# Altium footprint library MS-Electronic.PcbLib: 202 footprints (part 5 of 13)
Each footprint in its own frame and in the unit in brackets; x right, y up, seen from the top. Pads: shape width x height; smd on the part's side, far side on the other; paste and mask are expansions set on the pad; w line width, h text height; cw(c..) or ccw(c..) is an arc to the next point about the centre after c.
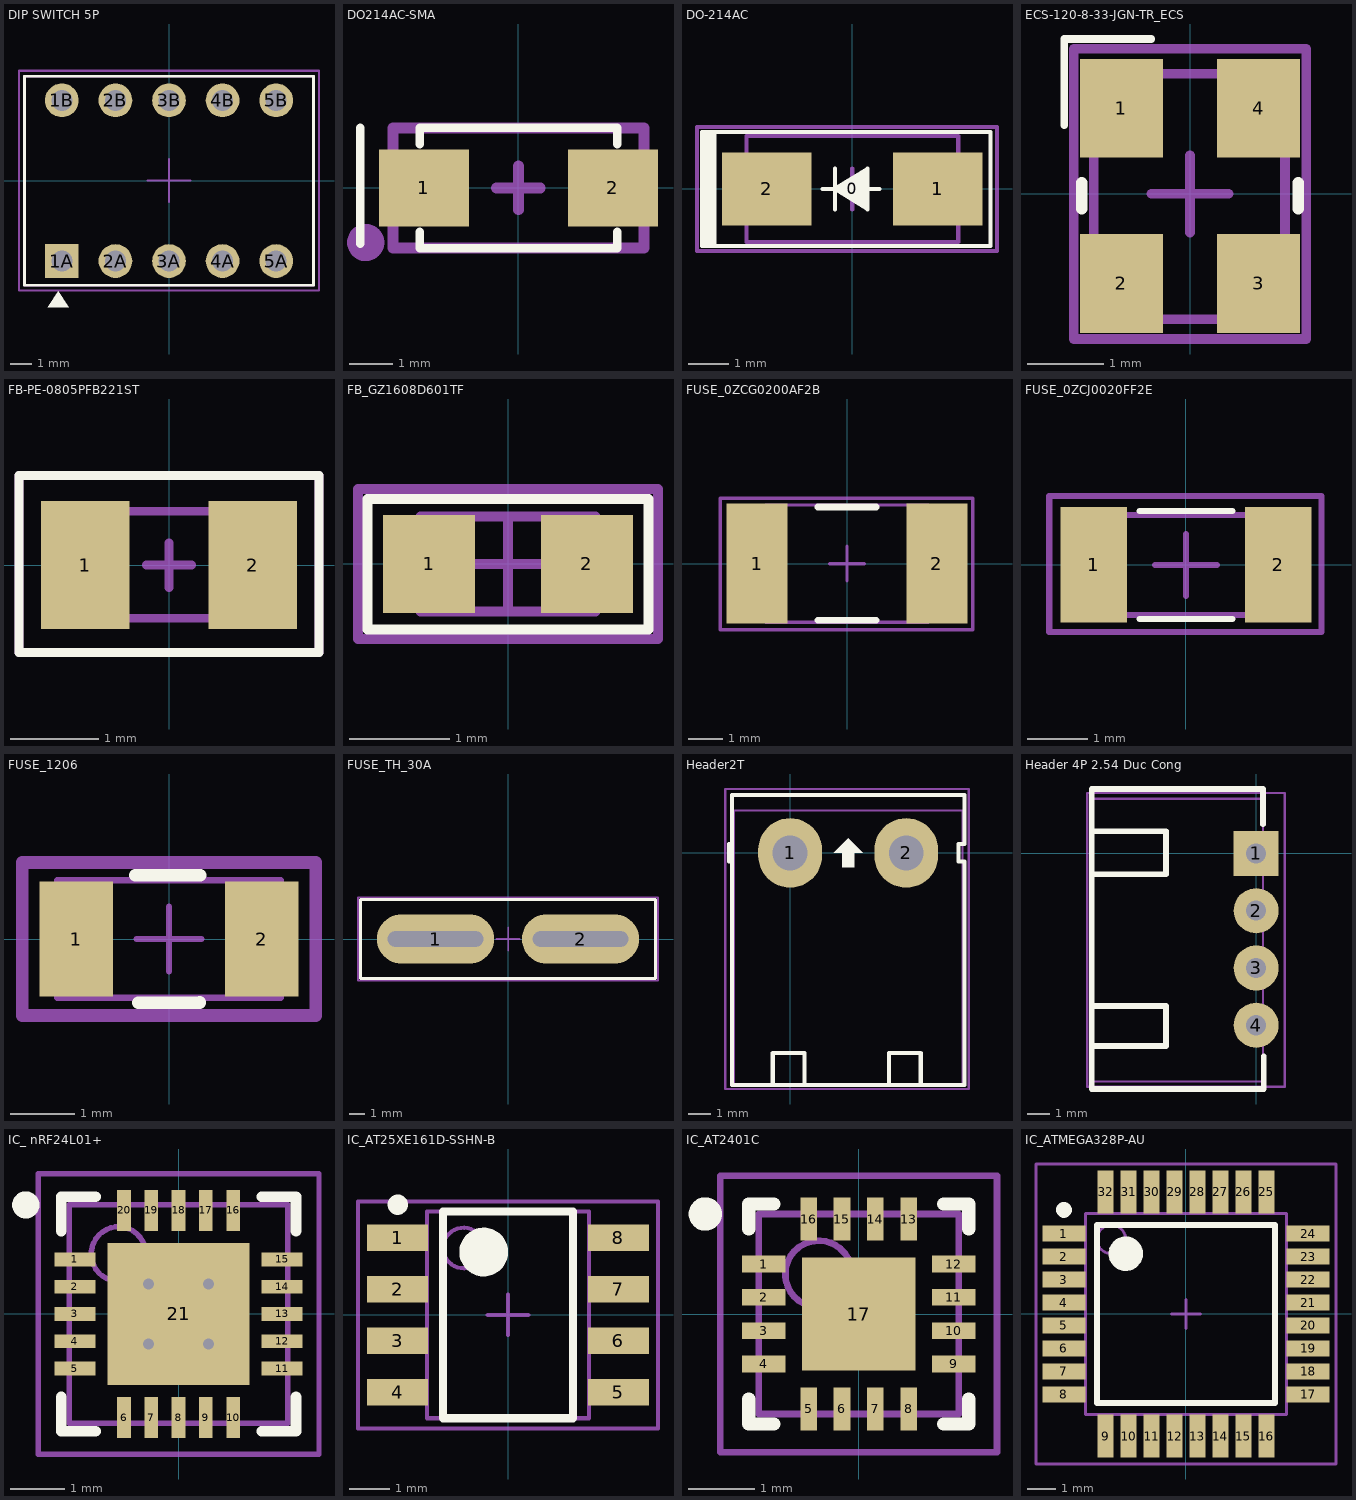
[diagram p4: the footprints below, top view; thin cyan lines are the x and y axes]

## DIP SWITCH 5P [mm]
pads (10):
  rect 1.6x1.6 hole 1: 1A(-5.08,-3.81)
  round 1.6 hole 1: 1B(-5.08,3.81) 2A(-2.54,-3.81) 2B(-2.54,3.81) 3A(0,-3.81) 3B(0,3.81) 4A(2.54,-3.81) 4B(2.54,3.81) 5A(5.08,-3.81) 5B(5.08,3.81)
Top Overlay:
  region: -5.25,-5.25 -4.75,-6 -5.75,-6
  lines w0.127: -6.85,-4.95 6.85,-4.95 6.85,4.95 -6.85,4.95 -6.85,-4.95
Top Assembly:
  lines w0.127: -6.85,-4.95 6.85,-4.95 6.85,4.95 -6.85,4.95 -6.85,-4.95
  text ".Designator" at -2.499,-0.167 h0.5
Top Component Center (Mech15):
  lines w0.1: -1.016,0 0,0 ; 0,-1.016 0,0 ; 0,1.016 0,0 ; 1.016,0 0,0 ; -7.112,-5.208 -7.112,5.212 7.112,5.212 7.112,-5.208 -7.112,-5.208
3D body "DIP Switch x05 Red.stp": height 6.95, standoff -3.3, extent -6.85,-4.95 6.85,4.95

## DO214AC-SMA [mm]
pads (2):
  rect 2.1x1.8 smd: 1(-2.2,0) 2(2.2,0)
Top Overlay:
  lines w0.2: -3.683,-1.303 -3.683,1.397 ; -2.3,-1.016 -2.3,-1.4 2.3,-1.4 2.3,-1.016 ; -2.3,1.016 -2.3,1.4 2.3,1.4 2.3,1.016
Top Assembly:
  circle w0.508: c-3.556,-1.27 r0.18
  lines w0.254: -2.921,-1.397 2.921,-1.397 2.921,1.397 -2.921,1.397 -2.921,-1.397
  text "'.Designator'" at -6.143,-0.574 h2.54
Top Component Center (Mech15):
  lines w0.254: -0.508,0 0,0 ; 0,-0.508 0,0 ; 0,0.508 0,0 ; 0.508,0 0,0 ; -2.921,-1.397 2.921,-1.397 2.921,1.397 -2.921,1.397 -2.921,-1.397
3D body "SW3dPS-DO-214AC SMA.STEP": height 2.41, standoff 0.01, extent -2.622,-1.3 2.578,1.3

## DO-214AC [mm]
pads (3):
  round 0.508 on Mech14: 0(0,0)
  rect 2.2x1.8 smd: 1(2.1,0) 2(-2.1,0)
Top Overlay:
  rectangle: -3.686,-1.399 -3.386,1.401
  region: 0.375,-0.5 0.375,0.5 -0.425,0
  lines w0.1: -0.725,0 -0.425,0 ; -0.425,-0.5 -0.425,0 ; -0.425,0.5 -0.425,0 ; 0.375,0 0.675,0 ; -0.425,0 0.375,-0.5 0.375,0.5 -0.425,0 ; -3.687,-1.4 -3.387,-1.4 -3.387,1.4 -3.687,1.4 -3.687,0.9 -3.687,-1.4 ; -3.4,-1.4 3.4,-1.4 3.4,1.4 -3.4,1.4 -3.4,-1.4
Top Assembly:
  lines w0.1: -2.6,-1.3 2.603,-1.3 2.603,1.298 -2.6,1.298 -2.6,-1.3
  text ".Designator" at -4.998,-0.333 h1
Mechanical 7:
  lines w0.1: -0.508,0 0,0 ; 0,-0.508 0,0 ; 0,0.508 0,0 ; 0.508,0 0,0
Top Component Center (Mech15):
  lines w0.1: -3.813,-1.524 3.556,-1.524 3.556,1.523 -3.813,1.523 -3.813,-1.524
3D body "SW3dPS-DO-214AC SMA.STEP": height 2.42, standoff 0.02, extent -2.6,-1.3 2.6,1.3

## ECS-120-8-33-JGN-TR_ECS [mil]
pads (4):
  rect 43x51 smd paste-21.5: 1(-35.43,44.28) 2(-35.43,-46.28) 3(35.43,-46.28) 4(35.43,44.28)
Top Overlay:
  lines w3.94: -65.07,35.49 -65.07,80 -20,80
  lines w6: -56,-7.68 -56,5.68 ; 56,-7.68 56,5.68
Top Assembly:
  circle w20: c-35,50 r5
  lines w5: -49.67,-64.86 -49.67,62.08 49.08,62.08 49.08,-64.86 -49.67,-64.86
  text "'.Designator'" at -133.34,-12.47 h55.12
Top Component Center (Mech15):
  lines w5: -20,0 0,0 ; 0,-20 0,0 ; 0,20 0,0 ; 20,0 0,0 ; -60,-75 -60,75 60,75 60,-75 -60,-75
3D body "ECS-120-8-33-JGN-TR.step": height 31.5, standoff 0, extent -49.21,-63.99 49.21,61.99

## FB-PE-0805PFB221ST [mm]
pads (2):
  rect 1x1.45 smd: 1(-0.95,0) 2(0.95,0)
Top Overlay:
  lines w0.1: -1.7,-0.991 1.7,-0.991 1.7,1.016 -1.7,1.016 -1.7,-0.991
Top Assembly:
  lines w0.1: -0.991,-0.602 -0.991,0.61 1.003,0.61 1.003,-0.602 -0.991,-0.602
  text ".Designator" at -2.499,-0.167 h0.5
Top Component Center (Mech15):
  lines w0.1: -0.254,0 0,0 ; 0,-0.254 0,0 ; 0,0.254 0,0 ; 0.254,0 0,0 ; -1.7,-0.991 -1.7,1.016 1.7,1.016 1.7,-0.991 -1.7,-0.991
3D body "L0805.step": height 0.8, standoff 0, extent -1,-0.6 1,0.6

## FB_GZ1608D601TF [mm]
height 0.95
pads (2):
  rect 0.92x0.98 smd: 1(-0.79,0) 2(0.79,0)
Top Overlay:
  lines w0.1: -1.406,-0.656 -1.406,0.649 1.404,0.649 1.404,-0.656 -1.406,-0.656
Top Assembly:
  lines w0.1: -0.875,-0.475 0.875,-0.475 0.875,0.475 -0.875,0.475 -0.875,-0.475
  text ".Designator" at -1.999,-0.133 h0.4
Top Component Center (Mech15):
  lines w0.1: -0.475,0 0.475,0 ; 0,-0.475 0,0.475 ; -1.5,-0.75 1.5,-0.75 1.5,0.75 -1.5,0.75 -1.5,-0.75
3D body "FB_GZ1608D601TF.step": height 0.95, standoff 0, extent -0.875,-0.475 0.875,0.475

## FUSE_0ZCG0200AF2B [mm]
pads (2):
  rect 1.78x3.5 smd: 1(-2.615,0) 2(2.615,0)
Top Overlay:
  lines w0.2: -0.85,-1.65 0.85,-1.65 ; -0.85,1.65 0.85,1.65
Top Assembly:
  lines w0.1: -2.365,-1.705 -2.365,1.705 2.365,1.705 2.365,-1.705 -2.365,-1.705
  text ".Designator" at -3.378,-0.339 h1.5
Top Component Center (Mech15):
  lines w0.1: -0.5,0 0.5,0 ; 0,-0.5 0,0.5 ; -3.683,-1.93 -3.683,1.905 3.658,1.905 3.658,-1.93 -3.683,-1.93
3D body "0ZCG0200AF2B.step": height 1.55, standoff 0, extent -2.365,-1.705 2.365,1.705

## FUSE_0ZCJ0020FF2E [mm]
pads (2):
  rect 1.1x1.9 smd mask+0.07: 1(-1.52,0) 2(1.52,0)
Top Overlay:
  lines w0.1: -0.762,-0.889 0.762,-0.889 ; -0.762,0.889 0.762,0.889
Top Assembly:
  lines w0.1: -1.625,-0.825 1.625,-0.825 1.625,0.825 -1.625,0.825 -1.625,-0.825
  text ".Designator" at -2.999,-0.2 h0.6
Top Component Center (Mech15):
  lines w0.1: -0.508,0 0,0 ; 0,-0.508 0,0 ; 0,0.508 0,0 ; 0.508,0 0,0 ; -2.252,-1.101 -2.252,1.132 2.23,1.132 2.23,-1.101 -2.252,-1.101
3D body "0ZCJ0020FF2E.stp": height 0.75, standoff 0, extent -1.625,-0.825 1.625,0.825

## FUSE_1206 [mm]
pads (2):
  rect 1.15x1.8 smd: 1(-1.45,0) 2(1.45,0)
Top Overlay:
  lines w0.2: -0.528,1 0.489,1 ; -0.483,-1 0.483,-0.995
Top Assembly:
  lines w0.1: -1.751,-0.923 -1.751,0.92 1.753,0.92 1.753,-0.923 -1.751,-0.923
  text ".Designator" at -3.999,-0.267 h0.8
Top Component Center (Mech15):
  lines w0.1: -0.508,0 0,0 ; 0,-0.508 0,0 ; 0,0.508 0,0 ; 0.508,0 0,0
  lines w0.2: -2.3,-1.2 2.3,-1.2 2.3,1.2 -2.3,1.2 -2.3,-1.2
3D body "fuse_silicon_1206L.step": height 0.5, standoff 0, extent -1.75,-0.92 1.75,0.92

## FUSE_TH_30A [mm]
pads (2):
  oval 7.6x3.2 hole 1 slot 6.2 at 0 deg mask+0.07: 1(-4.7,0) 2(4.7,0)
Top Overlay:
  lines w0.2: -9.55,-2.55 9.55,-2.55 9.55,2.55 -9.55,2.55 -9.55,-2.55
Top Assembly:
  lines w0.1: -9.55,-2.55 9.55,-2.55 9.55,2.55 -9.55,2.55 -9.55,-2.55
  text ".Designator" at -2.499,-0.167 h0.5
Top Component Center (Mech15):
  lines w0.1: -0.762,0 0,0 ; 0,-0.762 0,0 ; 0,0.762 0,0 ; 0.762,0 0,0 ; -9.724,-2.699 -9.724,2.716 9.716,2.716 9.716,-2.699 -9.724,-2.699
3D body "3D_model_0287000_PXS-PXCN_ATO-ATOF.stp": height 14.35, standoff -4.45, extent -9.55,-2.55 9.55,2.57

## Header2T [mil]
pads (2):
  oval 110x120 hole 60: 1(0,0) 2(200,0)
Top Overlay:
  region: 100,25 75,0 90,0 90,-25 110,-25 110,0 125,0
  lines w7: -105,-15 -105,15 ; -100,100 -100,-400 300,-400 300,-15 290,-15 290,15 300,15 300,100 -98,100 ; -30,-400 -30,-345 25,-345 25,-400 ; 170,-400 170,-345 225,-345 225,-400
Top Assembly:
  lines w3.94: -96.62,-399.24 297.06,-399.24 297.06,73.13 -96.62,73.13 -96.62,-399.24
  text ".Designator" at -98.39,-6.56 h19.68
Top Component Center (Mech15):
  lines w3.94: -35,0 0,0 ; 0,-35 0,0 ; 0,35 0,0 ; 35,0 0,0 ; -112.04,-406.81 -112.04,110 307.88,110 307.88,-406.81 -112.04,-406.81
3D body "SW3dPS-5EHDR_2P.STEP": height 333.51, standoff -157.48, extent -96.7,-399.22 297,73.22

## Header 4P 2.54 Duc Cong [mm]
pads (4):
  rect 2x2 hole 0.889: 1(0,0)
  round 2 hole 0.889: 2(0,-2.54) 3(0,-5.08) 4(0,-7.62)
Top Overlay:
  lines w0.254: -7.3,-6.766 -3.998,-6.766 -3.998,-8.544 -7.173,-8.544 ; -7.3,-0.924 -3.998,-0.924 -3.998,0.981 -7.3,0.981 ; 0.303,1.3 0.303,2.861 -7.3,2.861 -7.3,-10.449 0.33,-10.449 0.33,-9
Top Assembly:
  lines w0.1: -7.3,-10.12 0.3,-10.12 0.3,2.43 -7.3,2.43 -7.3,-10.12
  text ".Designator" at -2.999,-0.2 h0.6
Top Component Center (Mech15):
  lines w0.1: -0.762,0 0,0 ; 0,-0.762 0,0 ; 0,0.762 0,0 ; 0.762,0 0,0 ; -7.5,-10.353 1.273,-10.353 1.273,2.684 -7.5,2.684 -7.5,-10.353
3D body "User Library-XH2_54-4P-R-1.sldprt": height 5.9, standoff -3, extent -7.3,-10.07 0.3,2.43

## IC_ nRF24L01+ [mm]
height 0.95
pads (21):
  rect 0.75x0.25 smd: 1(-1.9,1) 2(-1.9,0.5) 3(-1.9,0) 4(-1.9,-0.5) 5(-1.9,-1) 11(1.9,-1) 12(1.9,-0.5) 13(1.9,0) 14(1.9,0.5) 15(1.9,1)
  rect 0.25x0.75 smd: 6(-1,-1.9) 7(-0.5,-1.9) 8(0,-1.9) 9(0.5,-1.9) 10(1,-1.9) 16(1,1.9) 17(0.5,1.9) 18(0,1.9) 19(-0.5,1.9) 20(-1,1.9)
  rect 2.6x2.6 smd: 21(0,0)
via 0.55,-0.55 diameter 0.5 hole 0.2
via -0.55,-0.55 diameter 0.5 hole 0.2
via 0.55,0.55 diameter 0.5 hole 0.2
via -0.55,0.55 diameter 0.5 hole 0.2
Top Overlay:
  circle w0.25: c-2.8,2 r0.125
  lines w0.2: -2.15,-1.525 -2.15,-2.15 -1.525,-2.15 ; -2.15,1.525 -2.15,2.15 -1.525,2.15 ; 1.525,-2.15 2.15,-2.15 2.15,-1.525 ; 1.525,2.15 2.15,2.15 2.15,1.525
Top Assembly:
  circle w0.1: c-1.1,1.1 r0.5
  lines w0.1: -2,-2 2,-2 2,2 -2,2 -2,-2
  text ".Designator" at -3.999,-0.267 h0.8
Top Component Center (Mech15):
  lines w0.1: -0.5,0 0.5,0 ; 0,-0.5 0,0.5 ; -2.575,-2.575 2.575,-2.575 2.575,2.575 -2.575,2.575 -2.575,-2.575
3D body "IC_ nRF24L01+.step": height 0.95, standoff 0, extent -2.001,-2.001 2.001,2.001

## IC_AT25XE161D-SSHN-B [mm]
height 1.6
pads (8):
  rect 1.5x0.65 smd: 1(-2.725,1.905) 2(-2.725,0.635) 3(-2.725,-0.635) 4(-2.725,-1.905) 5(2.725,-1.905) 6(2.725,-0.635) 7(2.725,0.635) 8(2.725,1.905)
Top Overlay:
  circle w0.6: c-0.6,1.55 r0.3
  circle w0.25: c-2.718,2.718 r0.125
  lines w0.2: -1.6,-2.55 1.6,-2.55 1.6,2.55 -1.6,2.55 -1.6,-2.55
Top Assembly:
  circle w0.1: c-1.1,1.65 r0.5
  lines w0.1: -2,-2.55 2,-2.55 2,2.55 -2,2.55 -2,-2.55
  text ".Designator" at -2.999,-0.2 h0.6
Top Component Center (Mech15):
  lines w0.1: -0.5,0 0.5,0 ; 0,-0.5 0,0.5 ; -3.7,-2.8 3.7,-2.8 3.7,2.8 -3.7,2.8 -3.7,-2.8
3D body "IC_AT25XE161D-SSHN-B.step": height 1.6, standoff 0, extent -2.997,-2.55 2.997,2.55

## IC_AT2401C [mm]
height 0.8
pads (17):
  rect 0.65x0.25 smd: 1(-1.425,0.75) 2(-1.425,0.25) 3(-1.425,-0.25) 4(-1.425,-0.75) 9(1.425,-0.75) 10(1.425,-0.25) 11(1.425,0.25) 12(1.425,0.75)
  rect 0.25x0.65 smd: 5(-0.75,-1.425) 6(-0.25,-1.425) 7(0.25,-1.425) 8(0.75,-1.425) 13(0.75,1.425) 14(0.25,1.425) 15(-0.25,1.425) 16(-0.75,1.425)
  rect 1.7x1.7 smd: 17(0,0)
Top Overlay:
  circle w0.25: c-2.3,1.5 r0.125
  lines w0.2: -1.65,-1.275 -1.65,-1.65 -1.275,-1.65 ; -1.65,1.275 -1.65,1.65 -1.275,1.65 ; 1.275,-1.65 1.65,-1.65 1.65,-1.275 ; 1.275,1.65 1.65,1.65 1.65,1.275
Top Assembly:
  circle w0.1: c-0.6,0.6 r0.5
  lines w0.1: -1.5,-1.5 1.5,-1.5 1.5,1.5 -1.5,1.5 -1.5,-1.5
  text ".Designator" at -2.999,-0.2 h0.6
Top Component Center (Mech15):
  lines w0.1: -0.5,0 0.5,0 ; 0,-0.5 0,0.5 ; -2.075,-2.075 2.075,-2.075 2.075,2.075 -2.075,2.075 -2.075,-2.075
3D body "IC_AT2401C.step": height 0.8, standoff 0, extent -1.501,-1.501 1.501,1.501

## IC_ATMEGA328P-AU [mm]
height 1.2
pads (32):
  rect 1.5x0.55 smd: 1(-4.25,2.8) 2(-4.25,2) 3(-4.25,1.2) 4(-4.25,0.4) 5(-4.25,-0.4) 6(-4.25,-1.2) 7(-4.25,-2) 8(-4.25,-2.8) 17(4.25,-2.8) 18(4.25,-2) 19(4.25,-1.2) 20(4.25,-0.4) 21(4.25,0.4) 22(4.25,1.2) 23(4.25,2) 24(4.25,2.8)
  rect 0.55x1.5 smd: 9(-2.8,-4.25) 10(-2,-4.25) 11(-1.2,-4.25) 12(-0.4,-4.25) 13(0.4,-4.25) 14(1.2,-4.25) 15(2,-4.25) 16(2.8,-4.25) 25(2.8,4.25) 26(2,4.25) 27(1.2,4.25) 28(0.4,4.25) 29(-0.4,4.25) 30(-1.2,4.25) 31(-2,4.25) 32(-2.8,4.25)
Top Overlay:
  circle w0.3: c-4.25,3.625 r0.125
  circle w0.6: c-2.1,2.1 r0.3
  lines w0.2: -3.1,-3.1 -3.1,3.1 3.1,3.1 3.1,-3.1 -3.1,-3.1
Top Assembly:
  circle w0.1: c-2.6,2.6 r0.5
  lines w0.1: -3.5,-3.5 -3.5,3.5 3.5,3.5 3.5,-3.5 -3.5,-3.5
  text ".Designator" at -4.998,-0.333 h1
Top Component Center (Mech15):
  lines w0.1: -0.5,0 0.5,0 ; 0,-0.5 0,0.5 ; -5.225,-5.225 -5.225,5.225 5.225,5.225 5.225,-5.225 -5.225,-5.225
3D body "IC_ATMEGA328P-AU.step": height 1.2, standoff 0, extent -4.5,-4.5 4.5,4.5